# Altium integrated library Convector_digit.IntLib: 33 symbols
Pins are listed as number, name and electrical type; pins without a type are passive.

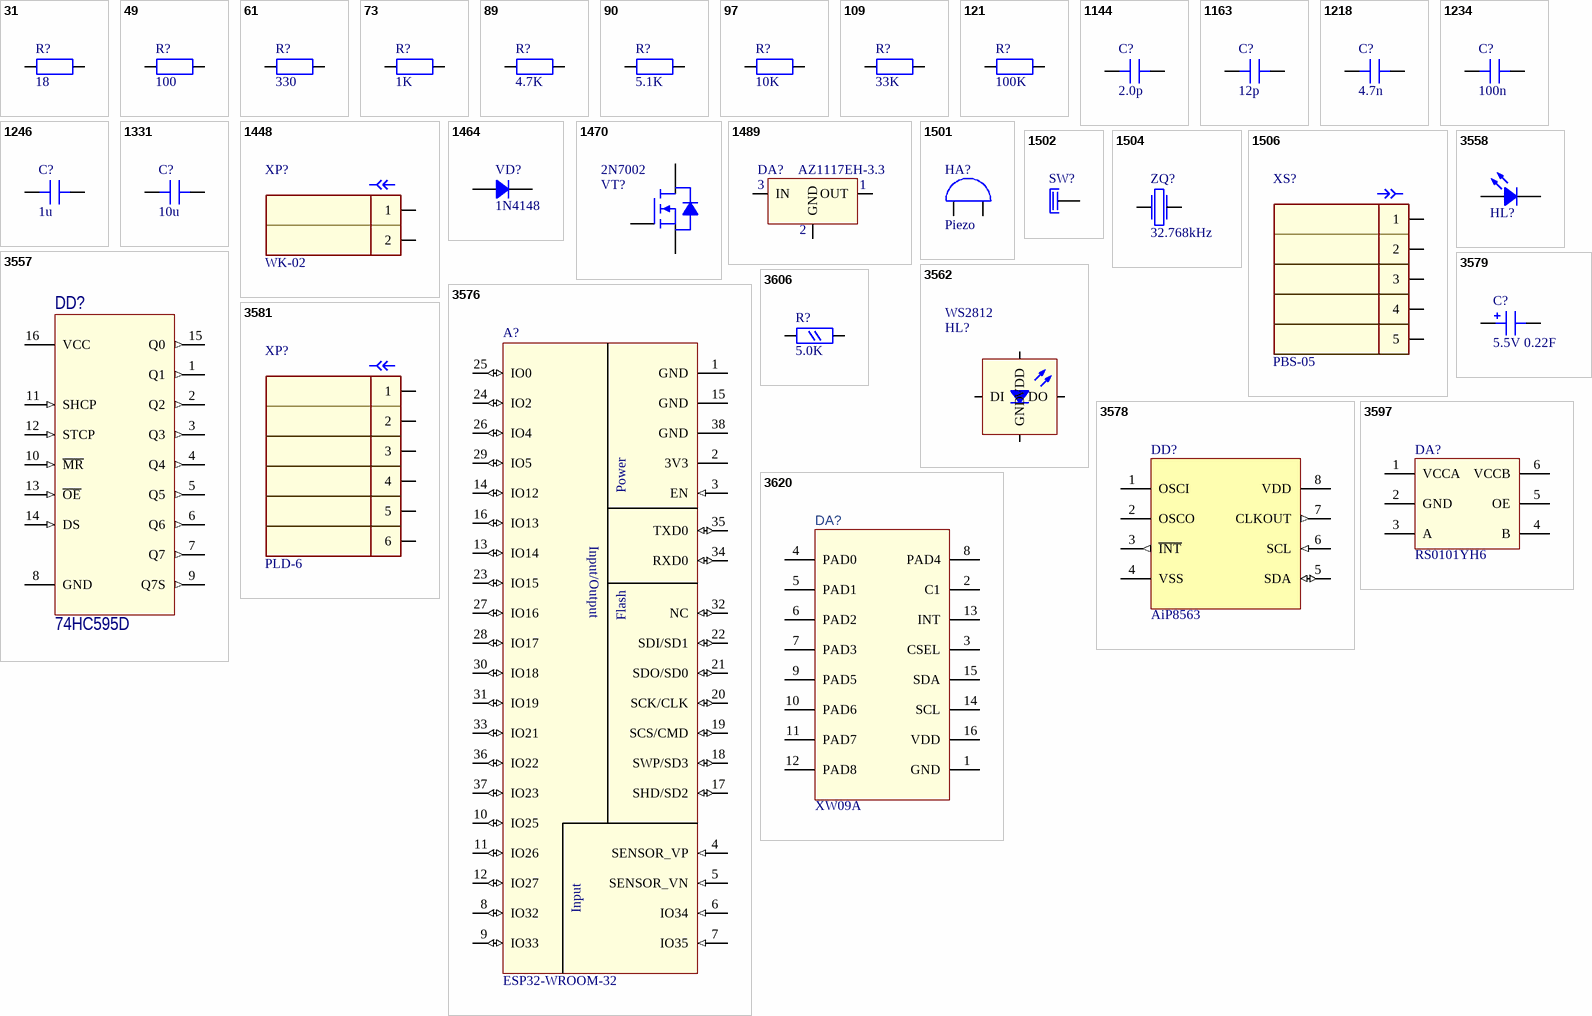
[diagram p0: symbols 31 to 3620]

## 31
designator R?, comment 18
Res, 0603, 1%, 1/10W; ID: 31; Symbol: Resistor; Type: Resistors; Value: 18; Footprint Type: SMD; Footprint: R0603
footprint R0603
pins: 1, 2

## 49
designator R?, comment 100
Res, 0603, 1%, 1/10W; Manufacturer: UNI-ROYAL(Uniroyal Elec); ID: 49; MFPN: 0603WAF1000T5E; LCPN: C22775; Symbol: Resistor; Type: Resistors; Value: 100; Footprint Type: SMD; Supplier: JLC; URL: https://lcsc.com/product-detail/Chip-Resistor-Surface-Mount_UNI-ROYAL-Uniroyal-Elec-0603WAF1000T5E_C22775.html; Footprint: R0603
footprint R0603
pins: 1, 2

## 61
designator R?, comment 330
Res, 0603, 1%, 1/10W; Manufacturer: Walsin Tech Corp; ID: 61; MFPN: WR06X3300FTL; LCPN: C163905; Symbol: Resistor; Type: Resistors; Value: 330; Footprint Type: SMD; Supplier: JLC; URL: https://lcsc.com/product-detail/Chip-Resistor-Surface-Mount_Walsin-Tech-Corp-WR06X3300FTL_C163905.html; Footprint: R0603
footprint R0603
pins: 1, 2

## 73
designator R?, comment 1K
Res, 0603, 1%, 1/10W; Manufacturer: FH(Guangdong Fenghua Advanced Tech); ID: 73; MFPN: RS-03K1002FT; LCPN: C115325; Symbol: Resistor; Type: Resistors; Value: 1K; Footprint Type: SMD; Supplier: JLC; URL: https://lcsc.com/product-detail/Chip-Resistor-Surface-Mount_FH-Guangdong-Fenghua-Advanced-Tech-RS-03K1001FT_C115325.html; Footprint: R0603
footprint R0603
pins: 1, 2

## 89
designator R?, comment 4.7K
Res, 0603, 1%, 1/10W; Manufacturer: UNI-ROYAL(Uniroyal Elec); ID: 89; MFPN: 0603WAF4701T5E; LCPN: C23162; Symbol: Resistor; Type: Resistors; Value: 4.7K; Footprint Type: SMD; Supplier: JLC; URL: https://lcsc.com/product-detail/Chip-Resistor-Surface-Mount_UNI-ROYAL-Uniroyal-Elec-0603WAF4701T5E_C23162.html; Footprint: R0603
footprint R0603
pins: 1, 2

## 90
designator R?, comment 5.1K
Res, 0603, 1%, 1/10W; ID: 90; MFPN: RS-03K5101FT; LCPN: C156350; Symbol: Resistor; Type: Resistors; Value: 5.1K; Footprint Type: SMD; Footprint: R0603
footprint R0603
pins: 1, 2

## 97
designator R?, comment 10K
Res, 0603, 1%, 1/10W; Manufacturer: FH(Guangdong Fenghua Advanced Tech); ID: 97; MFPN: RS-03K1002FT; LCPN: C115324; Symbol: Resistor; Type: Resistors; Value: 10K; Footprint Type: SMD; Supplier: JLC; URL: https://lcsc.com/product-detail/Chip-Resistor-Surface-Mount_FH-Guangdong-Fenghua-Advanced-Tech-RS-03K1002FT_C115324.html; Footprint: R0603
footprint R0603
pins: 1, 2

## 109
designator R?, comment 33K
Res, 0603, 1%, 1/10W; Manufacturer: UNI-ROYAL(Uniroyal Elec); ID: 109; MFPN: 0603WAF3302T5E; LCPN: C4216; Symbol: Resistor; Type: Resistors; Value: 33K; Footprint Type: SMD; Supplier: JLC; URL: https://lcsc.com/product-detail/Chip-Resistor-Surface-Mount_UNI-ROYAL-Uniroyal-Elec-0603WAF3302T5E_C4216.html; Footprint: R0603
footprint R0603
pins: 1, 2

## 121
designator R?, comment 100K
Res, 0603, 1%, 1/10W; Manufacturer: UNI-ROYAL(Uniroyal Elec); ID: 121; MFPN: 0603WAF1003T5E; LCPN: C25803; Symbol: Resistor; Type: Resistors; Value: 100K; Footprint Type: SMD; Supplier: JLC; URL: https://lcsc.com/product-detail/Chip-Resistor-Surface-Mount_UNI-ROYAL-Uniroyal-Elec-0603WAF1003T5E_C25803.html; Footprint: R0603
footprint R0603
pins: 1, 2

## 1144
designator C?, comment 2.0p
Cap Ceramic, 0603, 5%, 50V, NPO (C0G), -55 +125C; ID: 1144; Type: Capacitors; MFPN: CL10C020CB8NNNC; LCPN: C21895; Symbol: Capacitor; Value: 2.0p; Footprint Type: SMD; URL: https://lcsc.com/product-detail/Multilayer-Ceramic-Capacitors-MLCC-SMD-SMT_SAMSUNG_CL10C020CB8NNNC_2-0pF-020-0-25pF-50V_C21895.html; Footprint: C0603
footprint C0603
pins: 1, 2

## 1163
designator C?, comment 12p
Cap Ceramic, 0603, 5%, 50V, NPO (C0G), -55 +125C; ID: 1163; Type: Capacitors; MFPN: CL10C120JB8NNNC; LCPN: C38523; Symbol: Capacitor; Value: 12p; Footprint Type: SMD; URL: https://lcsc.com/product-detail/Multilayer-Ceramic-Capacitors-MLCC-SMD-SMT_Samsung-Electro-Mechanics-CL10C120JB8NNNC_C38523.html; Footprint: C0603
footprint C0603
pins: 1, 2

## 1218
designator C?, comment 4.7n
Cap Ceramic, 0603, ±10%, 50V, X7R (X5R), -55 +125C (-55 +85C); ID: 1218; Type: Capacitors; MFPN: 0603B472K500NT; LCPN: C53987; Symbol: Capacitor; Value: 4.7n; Footprint Type: SMD; Footprint: C0603
footprint C0603
pins: 1, 2

## 1234
designator C?, comment 100n
Cap Ceramic, 0603, ±10%, 50V, X7R (X5R), -55 +125C (-55 +85C); ID: 1234; Type: Capacitors; MFPN: 0603B104K500NT; LCPN: C187860; Symbol: Capacitor; Value: 100n; Footprint Type: SMD; URL: https://lcsc.com/product-detail/Multilayer-Ceramic-Capacitors-MLCC-SMD-SMT_YAGEO-CC0603KRX7R9BB104_C14663.html; Footprint: C0603
footprint C0603
pins: 1, 2

## 1246
designator C?, comment 1u
Cap Ceramic, 0603, ±10%, 50V, X7R (X5R), -55 +125C (-55 +85C); ID: 1246; Type: Capacitors; MFPN: CL10A105KO8NNNC; LCPN: C1592; Symbol: Capacitor; Value: 1u; Footprint Type: SMD; URL: https://lcsc.com/product-detail/Multilayer-Ceramic-Capacitors-MLCC-SMD-SMT_Samsung-Electro-Mechanics-CL10A105KO8NNNC_C1592.html; Footprint: C0603
footprint C0603
pins: 1, 2

## 1331
designator C?, comment 10u
Cap Ceramic, 0805, ±10%, 50V, X7R (X5R), -55 +125C (-55 +85C); ID: 1331; Type: Capacitors; Symbol: Capacitor; LCPN: C17024; Value: 10u; Footprint Type: SMD; Footprint: C0805
footprint C0805
pins: 1, 2

## 1448
designator XP?, comment WK-02
Through-hole type shrouded header, XH Series, 2.5mm; ID: 1448; MFPN: B2B-XH-A(LF)(SN); Value: B2B-XH-A (LF) (SN) (WK-02); LCPN: C158012; Symbol: MALE_2PIN; Type: Connectors; Footprint Type: TH; Supplier: JLC; URL: https://lcsc.com/product-detail/Wire-To-Board-Wire-To-Wire-Connector_JST-Sales-America_B2B-XH-A-LF-SN_JST-Sales-America-B2B-XH-A-LF-SN_C158012.html; Footprint: WK-02
footprint WK-02
pins: 1, 2

## 1464
designator VD?, comment 1N4148
Small Signal Fast Switching Diode, 150mA, 75V; ID: 1464; Type: Diodes; MFPN: 1N4148WS; Value: 1N4148WS; LCPN: C108805; Footprint Type: SMD; Supplier: JLC; URL: https://lcsc.com/product-detail/Switching-Diode_Shandong-Jingdao-Microelectronics-1N4148WS_C108805.html; Symbol: Diode; Footprint: SOD-323_DIODE
footprint SOD-323_DIODE
pins: A, C

## 1470
designator VT?, comment 2N7002
HEXFET Power MOSFET N-CH; ID: 1470; Type: Transistors; MFPN: GM7002E; LCPN: C8545; Symbol: N-MOS; Value: 2N7002; Footprint Type: SMD; Supplier: JLC; Footprint: SOT-23-3
footprint SOT-23-3
pins: X G, Y D, Z S

## 1489
designator DA?, comment AZ1117EH-3.3
IC, Vreg, LDO, For Low ESR MLCC Cout, SOT223; ID: 1489; MFPN: AZ1117EH-3.3TRG1; LCPN: C108494; Symbol: LDO_1117; Type: Microschemes; Value: AZ1117EH-3.3; Footprint Type: SMD; Supplier: JLC; URL: https://lcsc.com/product-detail/Low-Dropout-Regulators-LDO_DIODES_AZ1117EH-3-3TRG1_AZ1117EH-3-3TRG1_C108494.html; Footprint: SOT-223
footprint SOT-223 (SOT-223, 4-Leads, Body 6.5x3.5mm, Pitch 2.3mm, Lead Span 7mm, IPC Medium Density)
pins: X GND, Y OUT, Z IN
text: 3; 1; 2

## 1501
designator HA?, comment Piezo
BUZZER, Piezo, Pitch 5mm (TDK); ID: 1501; MFPN: PS1240P02BT; LCPN: C219727; Type: Audio; Value: Piezo; Footprint Type: TH; Supplier: LC; Symbol: Buzzer; Footprint: PS1240P02BT
footprint PS1240P02BT (Пьезоизлучатель)
pins: 1, 2

## 1502
designator SW?, comment XL-2258  (value not drawn)
Sensor Spring D=5.5/8.5, H=8.5±0.5mm; ID: 1502; Symbol: SENSOR_SPRING; Type: Switches; MFPN: XL-2258; Value: XL-2258; Footprint Type: TH; Supplier: TB - BIG; Footprint: XL-2258
footprint A-92 (A-92 Sensor Spring)
footprint XL-2258
pins: 1

## 1504
designator ZQ?, comment 32.768kHz
Quartz 32.768kHz 12.5pF 20ppm; ID: 1504; MFPN: FC-135 32.768000kHz 12.5 +20.0-20.0; LCPN: C164062; Type: Quartzes; Value: 32.768kHz; Footprint Type: SMD; Supplier: JLC; URL: https://lcsc.com/product-detail/SMD-Crystal-Resonators_TAE-Zhejiang-Abel-Elec-SMD-3215-2P32-768KHZ12-5PF10PPM_C164062.html; Symbol: QUARTZ; Footprint: KX-327NHT
footprint SMD-5032
footprint KX-327NHT
pins: 1, 2

## 1506
designator XS?, comment PBS-05
Through-hole type shrouded header, XH Series, 2.5mm; ID: 1506; MFPN: 2.54 单排排母5PIN，直插，塑高8.5mm; LCPN: C50950; Symbol: FEMALE_5PIN; Type: Connectors; Value: PBS-05; Footprint Type: TH; Supplier: JLC; Footprint: PBS-05
footprint PBS-05
pins: 1, 2, 3, 4, 5

## 3557
designator DD?, comment 74HC595D
Shift Register Serial to parallel, serial SOIC-16_150mil; Manufacturer: Shenzhen Fuman Elec; ID: 3557; MFPN: 74HC595D,118; LCPN: C2798023; Type: Microschemes; Value: 74HC595D; Footprint Type: SMD; Supplier: LC; URL: https://lcsc.com/product-detail/74-Series_Nexperia-74HC595D-118_C5947.html; Symbol: 74HC595D; Footprint: SO-16
footprint SO-16 (SOIC, 16-Leads, Body 9.9x3.9mm, Pitch 1.27mm)
pins: 1 Q1 (out) "TIM3_CH4,  USART3_RTS,  TIM14_CH1, TIM1_CH3N  ADC_IN9", 2 Q2 (out) "PB2", 3 Q3 (out) "SPI1_SCK, EVENTOUT", 4 Q4 (out) "SPI1_MISO, TIM17_BKIN,  TIM3_CH1, EVENTOUT", 5 Q5 (out) "SPI1_MOSI, I2C1_SMBA,  TIM16_BKIN,  TIM3_CH2  WKUP6", 6 Q6 (out) "I2C1_SCL, USART1_TX,  TIM16_CH1N", 7 Q7 (out) "I2C1_SDA, USART1_RX,  USART4_CTS,  TIM17_C", 8 GND (power) "SPI1_SCK ADC_IN5", 9 Q7S (out) "I2C1_SCL, TIM16_CH1", 10 ~{MR} (in) "USART2_TX, TIM15_CH1 ADC_IN2, WKUP4", 11 SHCP (in) "USART2_CTS,  USART4_TX  RTC_ TAMP2,  WKUP1, ADC_IN0,", 12 STCP (in) "USART2_RTS,  TIM15_CH1N,  USART4_RX, EVENTOUT  ADC_IN1", 13 ~{OE} (in) "USART2_RX, TIM15_CH2 ADC_IN3", 14 DS (in) "SPI1_NSS, TIM14_CH1,  USART2_CK,  USB_NOE(3)  ADC_IN4", 15 Q0 (out) "TIM3_CH3, TIM1_CH2N,  EVENTOUT,  USART3_CK  ADC_IN8", 16 VCC (power) "Device reset input / internal reset output (active low)"

## 3558
designator HL?, comment 0603 White  (value not drawn)
LED, SMD 0603, 30mA, White; Manufacturer: Orient; ID: 3558; MFPN: ORH-W46G; LCPN: C205448; Type: LED; Value: 0603 White; Footprint Type: SMD; Supplier: LC; URL: https://lcsc.com/product-detail/Light-Emitting-Diodes-LED_Orient-ORH-W46G_C205448.html; Symbol: LED; Footprint: LED0603Y
footprint LED0603Y
pins: A, C

## 3562
designator HL?, comment WS2812
Intelligent control LED, 2.0x2.0mm; Manufacturer: Worldsemi; ID: 3562; MFPN: WS2812C-2020; Value: WS2812C-2020; LCPN: C965556; Type: LED; Footprint Type: SMD; Supplier: LC; URL: https://lcsc.com/product-detail/Light-Emitting-Diodes-LED_Worldsemi-WS2812C-2020_C965556.html; Symbol: WS2812C-2020; Footprint: WS2812C-2020
footprint WS2812C-2020
pins: + VDD, - GND, I DI, O DO

## 3576
designator A?, comment ESP32-WROOM-32
Bluetooth, WiFi 802.11b/g/n, Bluetooth v4.2 +EDR, Class 1, 2 and 3 Transceiver Module 2.4GHz ~ 2.5GHz Integrated, Trace Surface Mount; Manufacturer: Espressif Systems; ID: 3576; LCPN: C82899; Type: Modules; MFPN: ESP32-WROOM-32; Value: ESP32-WROOM-32; Footprint Type: SMD; Supplier: LC; URL: https://lcsc.com/product-detail/WIFI-Modules_Espressif-Systems-ESP32-WROOM-32_C82899.html; Symbol: ESP32-WROOM-32; Footprint: ESP-WROOM-32
footprint ESP-WROOM-32
pins: 1 GND (power), 2 3V3 (power), 3 EN (in), 4 SENSOR_VP (in) "GPIO36, ADC1_CH0, RTC_GPIO0", 5 SENSOR_VN (in) "GPIO39, ADC1_CH3, RTC_GPIO3", 6 IO34 (in) "GPIO34, ADC1_CH6, RTC_GPIO4", 7 IO35 (in) "GPIO35, ADC1_CH7, RTC_GPIO", 8 IO32 (io) "GPIO32, XTAL_32K_P, ADC1_CH4, TOUCH9, RTC_GPIO9", 9 IO33 (io) "GPIO33, XTAL_32K_N, ADC1_CH5, TOUCH8, RTC_GPIO8", 10 IO25 (io) "GPIO25, DAC_1, ADC2_CH8, RTC_GPIO6, EMAC_RXD0", 11 IO26 (io) "GPIO26, DAC_2, ADC2_CH9, RTC_GPIO7, EMAC_RXD1", 12 IO27 (io) "GPIO27, ADC2_CH7, TOUCH7, RTC_GPIO17, EMAC_RX_DV", 13 IO14 (io) "GPIO14, ADC2_CH6, TOUCH6, RTC_GPIO16, MTMS, HSPICLK, HS2_CLK, SD_CLK, EMAC_TXD2", 14 IO12 (io) "GPIO12, ADC2_CH5, TOUCH5, RTC_GPIO15, MTDI, HSPIQ, HS2_DATA2, SD_DATA2, EMAC_TXD3", 15 GND (power), 16 IO13 (io) "GPIO13, ADC2_CH4, TOUCH4, RTC_GPIO14, MTCK, HSPID, HS2_DATA3, SD_DATA3, EMAC_RX_ER", 17 SHD/SD2 (io) "GPIO9, SD_DATA2, SPIHD, HS1_DATA2, U1RXD", 18 SWP/SD3 (io) "GPIO10, SD_DATA3, SPIWP, HS1_DATA3, U1TXD", 19 SCS/CMD (io) "GPIO11, SD_CMD, SPICS0, HS1_CMD, U1RTS", 20 SCK/CLK (io) "GPIO6, SD_CLK, SPICLK, HS1_CLK, U1CTS", 21 SDO/SD0 (io) "GPIO7, SD_DATA0, SPIQ, HS1_DATA0, U2RTS", 22 SDI/SD1 (io) "GPIO8, SD_DATA1, SPID, HS1_DATA1, U2CTS", 23 IO15 (io) "GPIO15, ADC2_CH3, TOUCH3, MTDO, HSPICS0, RTC_GPIO13, HS2_CMD, SD_CMD, EMAC_RXD3", 24 IO2 (io) "GPIO2, ADC2_CH2, TOUCH2, RTC_GPIO12, HSPIWP, HS2_DATA0, SD_DATA0", 25 IO0 (io) "GPIO0, ADC2_CH1, TOUCH1, RTC_GPIO11, CLK_OUT1, EMAC_TX_CLK", 26 IO4 (io) "GPIO4, ADC2_CH0, TOUCH0, RTC_GPIO10, HSPIHD, HS2_DATA1, SD_DATA1, EMAC_TX_ER", 27 IO16 (io) "GPIO16, HS1_DATA4, U2RXD, EMAC_CLK_OUT", 28 IO17 (io) "GPIO17, HS1_DATA5, U2TXD, EMAC_CLK_OUT_180", 29 IO5 (io) "GPIO5, VSPICS0, HS1_DATA6, EMAC_RX_CLK", 30 IO18 (io) "GPIO18, VSPICLK, HS1_DATA7", 31 IO19 (io) "GPIO19, VSPIQ, U0CTS, EMAC_TXD0", 32 NC (io), 33 IO21 (io) "GPIO21, VSPIHD, EMAC_TX_EN", 34 RXD0 (io) "GPIO3, U0RXD, CLK_OUT2", 35 TXD0 (io) "GPIO1, U0TXD, CLK_OUT3, EMAC_RXD2", 36 IO22 (io) "GPIO22, VSPIWP, U0RTS, EMAC_TXD1", 37 IO23 (io) "GPIO23, VSPID, HS1_STROBE", 38 GND (power)
text: Power; Input/Output; Flash; Input

## 3578
designator DD?, comment AiP8563
SOP-8 Real-time Clocks RoHS; Manufacturer: Wuxi I-core Elec; ID: 3578; LCPN: C116087; Type: Microschemes; MFPN: AiP8563; Value: AiP8563; Footprint Type: SMD; Symbol: AiP8563; Footprint: SO-8; Supplier: LC
footprint SO-8
footprint SO-8(uni)
pins: 1 OSCI, 2 OSCO, 3 ~{INT} (out), 4 VSS (power), 5 SDA (io), 6 SCL (in), 7 CLKOUT (out), 8 VDD (power)

## 3579
designator C?, comment 5.5V 0.22F
Ionistor 5.5V 0.22F; Manufacturer: WTSCAP (Wenting); ID: 3579; Type: Capacitors; MFPN: WTC5V50F22Z-0510H; LCPN: C389744; Symbol: Capacitor_polarised; Value: 5.5V 0.22F; Footprint Type: TH; Supplier: LC; URL: https://item.szlcsc.com/365848.html; Footprint: 1207H
footprint 1207H
pins: +, -

## 3581
designator XP?, comment PLD-6
2x3 Male pld pins 2.54; ID: 3581; Symbol: MALE_6PIN; Type: Connectors; Value: PLD-6; Footprint Type: TH; Footprint: PLD-6
footprint PLD-6
pins: 1, 2, 3, 4, 5, 6

## 3597
designator DA?, comment RS0101YH6
Level Translators, Shifters RoHS; Manufacturer: Jiangsu RUNIC Tech; ID: 3597; LCPN: C2762287; Type: Microschemes; MFPN: RS0101YH6; Value: RS0101YH6; Footprint Type: SMD; Supplier: LC; URL: https://lcsc.com/product-detail/Level-Translators-Shifters_Jiangsu-RUNIC-Tech-RS0101YH6_C2762287.html; Symbol: RS0101YH6; Footprint: SOT-23-6
footprint SOT-23-6
pins: 1 VCCA, 2 GND, 3 A, 4 B, 5 OE, 6 VCCB

## 3606
designator R?, comment 5.0K
Res, 0805, 0.1%, 1/8W; ID: 3606; LCPN: C78980; Symbol: Resistor_1/8W; Type: Resistors; Value: 5.0K; Footprint Type: SMD; Supplier: LC; Footprint: R0805
footprint R0805
pins: 1, 2

## 3620
designator DA?, comment XW09A
SOP-16 Touch Screen Controller ICs RoHS; Manufacturer: Sam&wing; Group: Микросхемы; ID: 3620; LCPN: C441720; Symbol: XW09X; Name: XW09A; Value: XW09A; Supplier: LC; LCSC_PartNumber: C441720; Type: Microschemes; MFPN: XW09A; Footprint Type: SMD; URL: https://lcsc.com/product-detail/Touch-Screen-Controller-ICs_Sam-wing-XW09A_C441720.html; Footprint: SO-16
footprint SO-16 (SOIC, 16-Leads, Body 9.9x3.9mm, Pitch 1.27mm)
pins: 1 GND "Input sensor port", 2 C1 "Input sensor port", 3 CSEL "Input sensor port", 4 PAD0 "Input sensor port", 5 PAD1 "Input sensor port", 6 PAD2 "Input sensor port", 7 PAD3 "Input sensor port", 8 PAD4 "Input sensor port", 9 PAD5 "Input sensor port", 10 PAD6 "Input sensor port", 11 PAD7 "Input sensor port", 12 PAD8 "Input sensor port", 13 INT "Input sensor port", 14 SCL "Input sensor port", 15 SDA "Input sensor port", 16 VDD "Input sensor port"